# Altium footprint library 430 integreted.PcbLib: 281 footprints (part 7 of 18)
Each footprint in its own frame and in the unit in brackets; x right, y up, seen from the top. Pads: shape width x height; smd on the part's side, far side on the other; paste and mask are expansions set on the pad; w line width, h text height; cw(c..) or ccw(c..) is an arc to the next point about the centre after c.
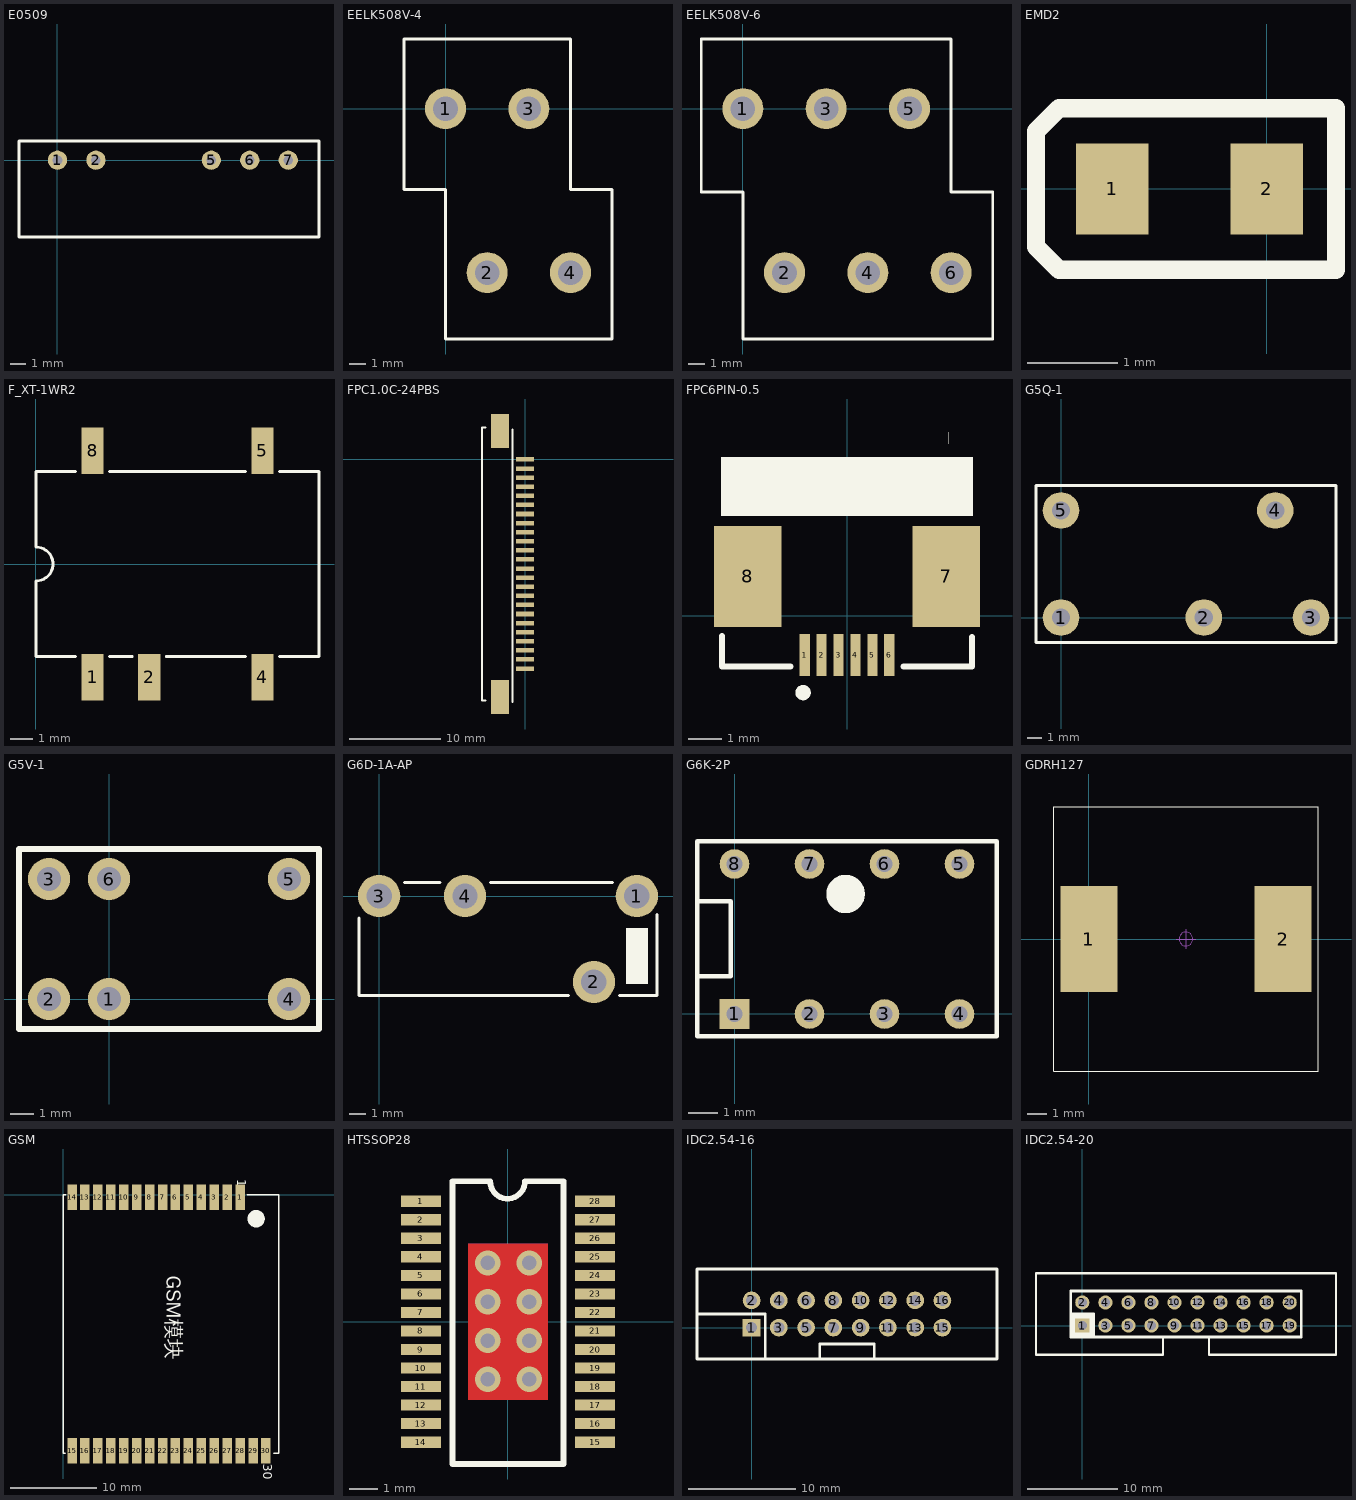
[diagram p6: the footprints below, top view; thin cyan lines are the x and y axes]

## E0509 [mm]
pads (5):
  round 1.27 hole 0.635: 1(0,0) 2(2.54,0) 5(10.16,0) 6(12.7,0) 7(15.24,0)
Top Overlay:
  lines w0.178: -2.54,-5.08 -2.54,1.27 17.272,1.27 17.272,-5.08 -2.54,-5.08

## EELK508V-4 [mm]
pads (4):
  round 2.5 hole 1.5: 1(0,0) 2(2.54,-10) 3(5.08,0) 4(7.62,-10)
Top Overlay:
  lines w0.178: -2.54,-4.92 -2.54,4.25 7.62,4.25 7.62,-2.38 7.62,-4.92 10.16,-4.92 10.16,-14.05 0,-14.05 0,-12.54 0,-10 0,-4.92 -2.54,-4.92

## EELK508V-6 [mm]
pads (6):
  round 2.5 hole 1.5: 1(0,0) 2(2.54,-10) 3(5.08,0) 4(7.62,-10) 5(10.16,0) 6(12.7,-10)
Top Overlay:
  lines w0.178: -2.54,-5.08 -2.54,4.25 12.7,4.25 12.7,-5.08 15.24,-5.08 15.24,-14.05 0,-14.05 0,-12.54 0,-10 0,-5.08 -2.54,-5.08

## EMD2 [mm]
pads (2):
  rect 0.8x1 smd: 1(-1.7,0) 2(0,0)
Top Overlay:
  lines w0.203: -2.54,-0.635 -2.286,-0.889 0.762,-0.889 0.762,0.889 -2.286,0.889 -2.54,0.635 -2.54,-0.635

## F_XT-1WR2 [mm]
pads (5):
  rect 1x2.1 smd: 1(2.54,-5.08) 2(5.08,-5.08) 4(10.16,-5.08) 5(10.16,5.08) 8(2.54,5.08)
Top Overlay:
  lines w0.127: 1.778,-4.15 0,-4.15 0,-0.762 ccw(c0,0) 0,0.762 0,4.15 1.778,4.15 ; 3.302,-4.15 4.318,-4.15 ; 3.302,4.15 9.398,4.15 ; 5.842,-4.15 9.398,-4.15 ; 10.922,-4.15 12.7,-4.15 12.7,4.15 10.922,4.15

## FPC1.0C-24PBS [mm]
pads (26):
  rect 2x0.5 smd: 1(0,0) 2(0,-1) 3(0,-2) 4(0,-3) 5(0,-4) 6(0,-5) 7(0,-6) 8(0,-7) 9(0,-8) 10(0,-9) 11(0,-10) 12(0,-11) 13(0,-12) 14(0,-13) 15(0,-14) 16(0,-15) 17(0,-16) 18(0,-17) 19(0,-18) 20(0,-19) 21(0,-20) 22(0,-21) 23(0,-22) 24(0,-23)
  rect 2x3.75 smd: ""(-2.75,-26.125) ""(-2.75,3.125)
Top Overlay:
  lines w0.2: -4.318,-26.5 -4.75,-26.5 -4.75,3.5 -4.318,3.5 ; -1.397,-26.698 -1.397,3.302

## FPC6PIN-0.5 [mm]
pads (8):
  rect 0.3x1.25 smd: 1(-1.25,-1.162) 2(-0.75,-1.162) 3(-0.25,-1.162) 4(0.25,-1.162) 5(0.75,-1.162) 6(1.25,-1.162)
  rect 2x3 smd: 7(2.94,1.163) 8(-2.94,1.163)
Top Overlay:
  circle w0.254: c-1.3,-2.275 r0.1
  region: 3,5.437 3,5.437 3,5.087 3,5.087
  rectangle: -3.725,2.95 3.725,4.7
  lines w0.178: -3.7,-0.6 -3.7,-1.5 -1.675,-1.5 ; 1.675,-1.5 3.7,-1.5 3.7,-0.625

## G5Q-1 [mm]
pads (5):
  round 2.6 hole 1.3: 1(0,0) 2(10.16,0) 3(17.78,0) 4(15.24,7.62) 5(0,7.62)
Top Overlay:
  lines w0.203: -1.778,-1.778 -1.778,9.398 19.558,9.398 19.558,-1.778 -1.778,-1.778

## G5V-1 [mil]
pads (6):
  round 70 hole 40: 1(0,0) 2(-100,0) 3(-100,200) 4(300,0) 5(300,200) 6(0,200)
Top Overlay:
  lines w10: -150,-50 350,-50 350,250 -150,250 -150,-50

## G6D-1A-AP [mm]
pads (4):
  round 2.5 hole 1.5: 1(15.24,0) 2(12.7,-5.08) 3(0,0) 4(5.08,0)
Top Overlay:
  rectangle: 14.6,-5.2 15.9,-1.9
  lines w0.178: -1.2,-1.3 -1.2,-5.88 11.2,-5.88 ; 1.5,0.8 3.6,0.8 ; 6.6,0.8 13.8,0.8 ; 14.2,-5.88 16.44,-5.88 16.44,-1.1

## G6K-2P [mm]
pads (8):
  rect 1x1 hole 0.55: 1(0,0)
  round 1 hole 0.55: 2(2.54,0) 3(5.08,0) 4(7.62,0) 5(7.62,5.08) 6(5.08,5.08) 7(2.54,5.08) 8(0,5.08)
Top Overlay:
  circle w0.7: c3.764,4.064 r0.3
  lines w0.152: -1.27,1.27 -0.127,1.27 -0.127,1.905 -0.127,3.81 -1.27,3.81 ; -1.27,-0.762 -1.27,5.842 8.89,5.842 8.89,-0.762 -1.27,-0.762

## GDRH127 [mm]
pads (2):
  rect 2.9x5.4 smd: 1(0,0) 2(9.9,0)
Top Overlay:
  lines w0.05: -1.8,-6.75 11.7,-6.75 11.7,6.75 -1.8,6.75 -1.8,-6.75
Mechanical 16:
  circle w0.05: c4.95,0 r0.35
  lines w0.05: 4.45,0 5.45,0 ; 4.95,-0.5 4.95,0.5

## GSM [mm]
pads (30):
  rect 1.1x3 smd: 1(20.5,-0.3) 2(19,-0.3) 3(17.5,-0.3) 4(16,-0.3) 5(14.5,-0.3) 6(13,-0.3) 7(11.5,-0.3) 8(10,-0.3) 9(8.5,-0.3) 10(7,-0.3) 11(5.5,-0.3) 12(4,-0.3) 13(2.5,-0.3) 14(1,-0.3) 15(1,-29.7) 16(2.5,-29.7) 17(4,-29.7) 18(5.5,-29.7) 19(7,-29.7) 20(8.5,-29.7) 21(10,-29.7) 22(11.5,-29.7) 23(13,-29.7) 24(14.5,-29.7) 25(16,-29.7) 26(17.5,-29.7) 27(19,-29.7) 28(20.5,-29.7) 29(22,-29.7) 30(23.5,-29.7)
Top Overlay:
  circle w1: c22.352,-2.794 r0.508
  lines w0.178: 0.226,-30 0,-30 0,0 0.254,0 ; 21.336,0 25,0 25,-30 24.412,-30
  text "GSM模块" at 11.43,-9.398 h3
  text "1" at 19.812,1.778 h1.78
  text "30" at 22.86,-31.242 h1.78

## HTSSOP28 [mm]
pads (28):
  rect 1.397x0.4 smd: 1(-3.059,4.225) 2(-3.059,3.575) 3(-3.059,2.925) 4(-3.059,2.275) 5(-3.059,1.625) 6(-3.059,0.975) 7(-3.059,0.325) 8(-3.059,-0.325) 9(-3.059,-0.975) 10(-3.059,-1.625) 11(-3.059,-2.275) 12(-3.059,-2.925) 13(-3.059,-3.575) 14(-3.059,-4.225) 15(3.06,-4.225) 16(3.06,-3.575) 17(3.06,-2.925) 18(3.06,-2.275) 19(3.06,-1.625) 20(3.06,-0.975) 21(3.06,-0.325) 22(3.06,0.325) 23(3.06,0.975) 24(3.06,1.625) 25(3.06,2.275) 26(3.06,2.925) 27(3.06,3.575) 28(3.06,4.225)
via -0.712,-0.662 diameter 0.889 hole 0.508
via -0.712,0.701 diameter 0.889 hole 0.508
via 0.748,2.064 diameter 0.889 hole 0.508
via 0.748,-2.025 diameter 0.889 hole 0.508
via -0.712,-2.025 diameter 0.889 hole 0.508
via 0.748,-0.662 diameter 0.889 hole 0.508
via 0.748,0.701 diameter 0.889 hole 0.508
via -0.712,2.064 diameter 0.889 hole 0.508
Top Layer:
  rectangle: -1.4,-2.75 1.4,2.75
Bottom Layer:
  rectangle: -1.4,-2.75 1.4,2.75
Top Overlay:
  lines w0.2: -0.63,4.936 -1.95,4.936 -1.95,-4.995 1.95,-4.995 1.95,4.936 0.597,4.936 ; -0.625,4.929 ccw(c-0.015,4.929) 0.594,4.929
3D body: height 1.05, standoff 0, extent -3.21,-4.919 3.39,4.881

## IDC2.54-16 [mil]
pads (16):
  rect 65x65 hole 40: 1(0,0)
  round 65 hole 40: 2(0,100) 3(100,0) 4(100,100) 5(200,0) 6(200,100) 7(300,0) 8(300,100) 9(400,0) 10(400,100) 11(500,0) 12(500,100) 13(600,0) 14(600,100) 15(700,0) 16(700,100)
Top Overlay:
  lines w10: -200,50 50,50 50,-115 ; 250,-115 250,-60 450,-60 450,-115 ; -200,-115 900,-115 900,215 -200,215 -200,-115

## IDC2.54-20 [mil]
pads (20):
  rect 62x62 hole 39.37: 1(0,0)
  round 62 hole 39.37: 2(0,100) 3(100,0) 4(100,100) 5(200,0) 6(200,100) 7(300,0) 8(300,100) 9(400,0) 10(400,100) 11(500,0) 12(500,100) 13(600,0) 14(600,100) 15(700,0) 16(700,100) 17(800,0) 18(800,100) 19(900,0) 20(900,100)
Top Overlay:
  rectangle: -50,-50 49,52
  lines w10: 350,-50 350,-127.17 -201.18,-127.17 -201.18,227.16 1101.18,227.16 1101.18,-127.17 550,-127.17 550,-50
  lines w12: -50,50 50,50 50,-50 ; -50,-50 -50,150 950,150 950,-50 -50,-50
3D body: height 352.36, standoff -114.17, extent -201,-123.27 1099,235